# Altium footprint library PCB_Connector.PcbLib: 86 footprints (part 4 of 6)
Each footprint in its own frame and in the unit in brackets; x right, y up, seen from the top. Pads: shape width x height; smd on the part's side, far side on the other; paste and mask are expansions set on the pad; w line width, h text height; cw(c..) or ccw(c..) is an arc to the next point about the centre after c.
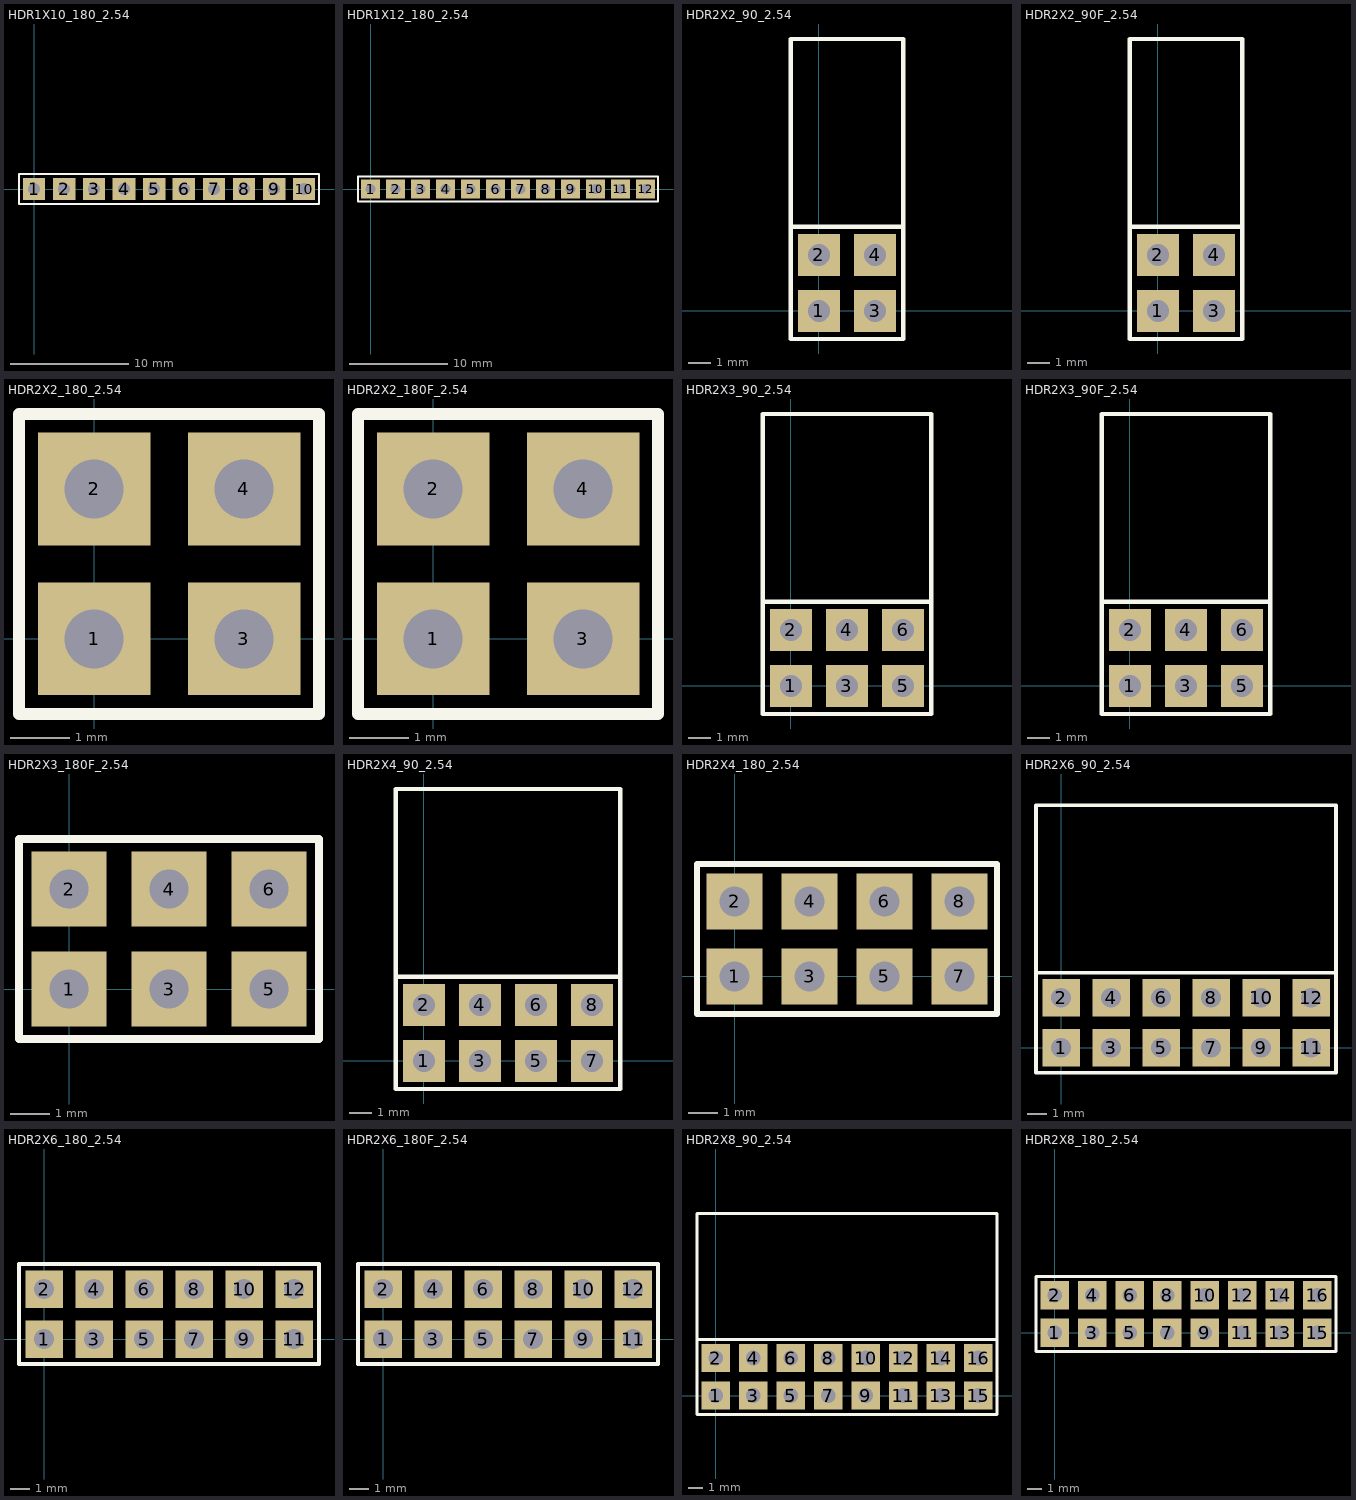
[diagram p3: the footprints below, top view; thin cyan lines are the x and y axes]

## HDR1X10_180_2.54 [mm] "Connector; Header; 8 Position"
height 4.3
pads (10):
  rect 1.905x1.905 hole 1: 1(0,0) 2(2.54,0) 3(5.08,0) 4(7.62,0) 5(10.16,0) 6(12.7,0) 7(15.24,0) 8(17.78,0) 9(20.32,0) 10(22.86,0)
Top Overlay:
  lines w0.2: -1.27,-1.27 24.13,-1.27 24.13,1.27 -1.27,1.27 -1.27,-1.27
3D body: height 7.58, standoff -2.94, extent 21.59,-1.27 24.13,1.27
3D body: height 7.58, standoff -2.94, extent 19.05,-1.27 21.59,1.27
3D body: height 7.58, standoff -2.94, extent 16.51,-1.27 19.05,1.27
3D body: height 7.58, standoff -2.94, extent 13.97,-1.27 16.51,1.27
3D body: height 7.58, standoff -2.94, extent 11.43,-1.27 13.97,1.27
3D body: height 7.58, standoff -2.94, extent 8.89,-1.27 11.43,1.27
3D body: height 7.58, standoff -2.94, extent 6.35,-1.27 8.89,1.27
3D body: height 7.58, standoff -2.94, extent 1.27,-1.27 3.81,1.27
3D body: height 7.58, standoff -2.94, extent 3.81,-1.27 6.35,1.27
3D body: height 7.58, standoff -2.94, extent -1.27,-1.27 1.27,1.27

## HDR1X12_180_2.54 [mm] "Connector; Header; 8 Position"
height 4.3
pads (12):
  rect 1.905x1.905 hole 1: 1(0,0) 2(2.54,0) 3(5.08,0) 4(7.62,0) 5(10.16,0) 6(12.7,0) 7(15.24,0) 8(17.78,0) 9(20.32,0) 10(22.86,0) 11(25.4,0) 12(27.94,0)
Top Overlay:
  lines w0.2: -1.27,-1.27 -1.27,1.27 29.21,1.27 29.21,-1.27 -1.27,-1.27
3D body: height 7.58, standoff -2.94, extent 24.13,-1.27 26.67,1.27
3D body: height 7.58, standoff -2.94, extent 26.67,-1.27 29.21,1.27
3D body: height 7.58, standoff -2.94, extent -1.27,-1.27 1.27,1.27
3D body: height 7.58, standoff -2.94, extent 3.81,-1.27 6.35,1.27
3D body: height 7.58, standoff -2.94, extent 1.27,-1.27 3.81,1.27
3D body: height 7.58, standoff -2.94, extent 6.35,-1.27 8.89,1.27
3D body: height 7.58, standoff -2.94, extent 8.89,-1.27 11.43,1.27
3D body: height 7.58, standoff -2.94, extent 11.43,-1.27 13.97,1.27
3D body: height 7.58, standoff -2.94, extent 13.97,-1.27 16.51,1.27
3D body: height 7.58, standoff -2.94, extent 16.51,-1.27 19.05,1.27
3D body: height 7.58, standoff -2.94, extent 19.05,-1.27 21.59,1.27
3D body: height 7.58, standoff -2.94, extent 21.59,-1.27 24.13,1.27

## HDR2X2_90_2.54 [mm] "Connector; Header; 2x2 Position"
height 4.3
pads (4):
  rect 1.905x1.905 hole 1: 1(0,0) 2(0,2.54) 3(2.54,0) 4(2.54,2.54)
Top Overlay:
  lines w0.2: -1.27,3.81 3.81,3.81 ; -1.27,-1.27 -1.27,12.319 3.81,12.319 3.81,-1.27 -1.27,-1.27
3D body: height 5.04, standoff -2.96, extent -1.27,-0.307 3.81,12.573

## HDR2X2_90F_2.54 [mm] "Connector; Header; 2x2 Position"
height 4.3
pads (4):
  rect 1.905x1.905 hole 1: 1(0,0) 2(0,2.54) 3(2.54,0) 4(2.54,2.54)
Top Overlay:
  lines w0.2: -1.27,3.81 3.81,3.81 ; -1.27,-1.27 -1.27,12.319 3.81,12.319 3.81,-1.27 -1.27,-1.27
3D body: height 5.04, standoff -3.16, extent -1.395,-0.163 3.935,12.437

## HDR2X2_180_2.54 [mm] "Connector; Header; 2x2 Position"
height 4.3
pads (4):
  rect 1.905x1.905 hole 1: 1(0,0) 2(0,2.54) 3(2.54,0) 4(2.54,2.54)
Top Overlay:
  lines w0.2: -1.27,-1.27 3.81,-1.27 3.81,3.81 -1.27,3.81 -1.27,-1.27
3D body: height 7.58, standoff -2.94, extent 1.27,-1.27 3.81,1.27
3D body: height 7.58, standoff -2.94, extent -1.27,-1.27 1.27,1.27
3D body: height 7.58, standoff -2.94, extent 1.27,1.27 3.81,3.81
3D body: height 7.58, standoff -2.94, extent -1.27,1.27 1.27,3.81

## HDR2X2_180F_2.54 [mm] "Connector; Header; 2x2 Position"
height 4.3
pads (4):
  rect 1.905x1.905 hole 1: 1(0,0) 2(0,2.54) 3(2.54,0) 4(2.54,2.54)
Top Overlay:
  lines w0.2: -1.27,-1.27 3.81,-1.27 3.81,3.81 -1.27,3.81 -1.27,-1.27
3D body: height 8.5, standoff -3.2, extent -1.395,-1.23 3.935,3.77

## HDR2X3_90_2.54 [mm] "Connector; Header; 2x2 Position"
height 4.3
pads (6):
  rect 1.905x1.905 hole 1: 1(0,0) 2(0,2.54) 3(2.54,0) 4(2.54,2.54) 5(5.08,0) 6(5.08,2.54)
Top Overlay:
  lines w0.2: -1.27,3.81 6.35,3.81 ; -1.27,-1.27 -1.27,12.319 6.35,12.319 6.35,-1.27 -1.27,-1.27
3D body: height 5.04, standoff -2.96, extent -1.27,-0.316 6.35,12.564

## HDR2X3_90F_2.54 [mm] "Connector; Header; 2x2 Position"
height 4.3
pads (6):
  rect 1.905x1.905 hole 1: 1(0,0) 2(0,2.54) 3(2.54,0) 4(2.54,2.54) 5(5.08,0) 6(5.08,2.54)
Top Overlay:
  lines w0.2: -1.27,3.81 6.35,3.81 ; -1.27,-1.27 6.35,-1.27 6.35,12.319 -1.27,12.319 -1.27,-1.27
3D body: height 5.04, standoff -3.16, extent -1.395,-0.154 6.475,12.446

## HDR2X3_180F_2.54 [mm] "Connector; Header; 2x2 Position"
height 4.3
pads (6):
  rect 1.905x1.905 hole 1: 1(0,0) 2(0,2.54) 3(2.54,0) 4(2.54,2.54) 5(5.08,0) 6(5.08,2.54)
Top Overlay:
  lines w0.2: -1.27,-1.27 -1.27,3.81 6.35,3.81 6.35,-1.27 -1.27,-1.27
3D body: height 8.5, standoff -3.2, extent -1.395,-1.23 6.475,3.77

## HDR2X4_90_2.54 [mm] "Connector; Header; 2x2 Position"
height 4.3
pads (8):
  rect 1.905x1.905 hole 1: 1(0,0) 2(0,2.54) 3(2.54,0) 4(2.54,2.54) 5(5.08,0) 6(5.08,2.54) 7(7.62,0) 8(7.62,2.54)
Top Overlay:
  lines w0.2: -1.27,3.81 8.89,3.81 ; -1.27,-1.27 8.89,-1.27 8.89,12.319 -1.27,12.319 -1.27,-1.27
3D body: height 5.04, standoff -2.96, extent -1.27,-0.307 3.81,12.573
3D body: height 5.04, standoff -2.96, extent 3.81,-0.307 8.89,12.573

## HDR2X4_180_2.54 [mm] "Connector; Header; 4x2 Position"
height 4.3
pads (8):
  rect 1.905x1.905 hole 1: 1(0,0) 2(0,2.54) 3(2.54,0) 4(2.54,2.54) 5(5.08,0) 6(5.08,2.54) 7(7.62,0) 8(7.62,2.54)
Top Overlay:
  lines w0.2: -1.27,-1.27 -1.27,3.81 8.89,3.81 8.89,-1.27 -1.27,-1.27
3D body: height 7.58, standoff -2.94, extent 1.27,1.27 3.81,3.81
3D body: height 7.58, standoff -2.94, extent -1.27,1.27 1.27,3.81
3D body: height 7.58, standoff -2.94, extent -1.27,-1.27 1.27,1.27
3D body: height 7.58, standoff -2.94, extent 3.81,1.27 6.35,3.81
3D body: height 7.58, standoff -2.94, extent 1.27,-1.27 3.81,1.27
3D body: height 7.58, standoff -2.94, extent 3.81,-1.27 6.35,1.27
3D body: height 7.58, standoff -2.94, extent 6.35,1.27 8.89,3.81
3D body: height 7.58, standoff -2.94, extent 6.35,-1.27 8.89,1.27

## HDR2X6_90_2.54 [mm] "Connector; Header; 2x2 Position"
height 4.3
pads (12):
  rect 1.905x1.905 hole 1: 1(0,0) 2(0,2.54) 3(2.54,0) 4(2.54,2.54) 5(5.08,0) 6(5.08,2.54) 7(7.62,0) 8(7.62,2.54) 9(10.16,0) 10(10.16,2.54) 11(12.7,0) 12(12.7,2.54)
Top Overlay:
  lines w0.2: -1.27,3.81 13.97,3.81 ; -1.27,-1.27 -1.27,12.319 13.97,12.319 13.97,-1.27 -1.27,-1.27
3D body: height 5.04, standoff -2.96, extent 6.35,-0.316 13.97,12.564
3D body: height 5.04, standoff -2.96, extent -1.27,-0.316 6.35,12.564

## HDR2X6_180_2.54 [mm] "Connector; Header; 8x2 Position"
height 4.3
pads (12):
  rect 1.905x1.905 hole 1: 1(0,0) 2(0,2.54) 3(2.54,0) 4(2.54,2.54) 5(5.08,0) 6(5.08,2.54) 7(7.62,0) 8(7.62,2.54) 9(10.16,0) 10(10.16,2.54) 11(12.7,0) 12(12.7,2.54)
Top Overlay:
  lines w0.2: -1.27,-1.27 13.97,-1.27 13.97,3.81 -1.27,3.81 -1.27,-1.27
3D body: height 7.58, standoff -2.94, extent 11.43,-1.27 13.97,1.27
3D body: height 7.58, standoff -2.94, extent 8.89,-1.27 11.43,1.27
3D body: height 7.58, standoff -2.94, extent 6.35,-1.27 8.89,1.27
3D body: height 7.58, standoff -2.94, extent 3.81,-1.27 6.35,1.27
3D body: height 7.58, standoff -2.94, extent 1.27,-1.27 3.81,1.27
3D body: height 7.58, standoff -2.94, extent -1.27,-1.27 1.27,1.27
3D body: height 7.58, standoff -2.94, extent 11.43,1.27 13.97,3.81
3D body: height 7.58, standoff -2.94, extent 8.89,1.27 11.43,3.81
3D body: height 7.58, standoff -2.94, extent 6.35,1.27 8.89,3.81
3D body: height 7.58, standoff -2.94, extent 3.81,1.27 6.35,3.81
3D body: height 7.58, standoff -2.94, extent 1.27,1.27 3.81,3.81
3D body: height 7.58, standoff -2.94, extent -1.27,1.27 1.27,3.81

## HDR2X6_180F_2.54 [mm] "Connector; Header; 8x2 Position"
height 4.3
pads (12):
  rect 1.905x1.905 hole 1: 1(0,0) 2(0,2.54) 3(2.54,0) 4(2.54,2.54) 5(5.08,0) 6(5.08,2.54) 7(7.62,0) 8(7.62,2.54) 9(10.16,0) 10(10.16,2.54) 11(12.7,0) 12(12.7,2.54)
Top Overlay:
  lines w0.2: -1.27,-1.27 -1.27,3.81 13.97,3.81 13.97,-1.27 -1.27,-1.27
3D body: height 8.5, standoff -3.2, extent -1.395,-1.23 6.475,3.77
3D body: height 8.5, standoff -3.2, extent 6.225,-1.23 14.095,3.77

## HDR2X8_90_2.54 [mm] "Connector; Header; 2x2 Position"
height 4.3
pads (16):
  rect 1.905x1.905 hole 1: 1(0,0) 2(0,2.54) 3(2.54,0) 4(2.54,2.54) 5(5.08,0) 6(5.08,2.54) 7(7.62,0) 8(7.62,2.54) 9(10.16,0) 10(10.16,2.54) 11(12.7,0) 12(12.7,2.54) 13(15.24,0) 14(15.24,2.54) 15(17.78,0) 16(17.78,2.54)
Top Overlay:
  lines w0.2: -1.27,3.81 19.05,3.81 ; -1.27,-1.27 -1.27,12.319 19.05,12.319 19.05,-1.27 -1.27,-1.27
3D body: height 5.04, standoff -2.96, extent -1.27,-0.307 3.81,12.573
3D body: height 5.04, standoff -2.96, extent 3.81,-0.307 8.89,12.573
3D body: height 5.04, standoff -2.96, extent 8.89,-0.307 13.97,12.573
3D body: height 5.04, standoff -2.96, extent 13.97,-0.307 19.05,12.573

## HDR2X8_180_2.54 [mm] "Connector; Header; 8x2 Position"
height 4.3
pads (16):
  rect 1.905x1.905 hole 1: 1(0,0) 2(0,2.54) 3(2.54,0) 4(2.54,2.54) 5(5.08,0) 6(5.08,2.54) 7(7.62,0) 8(7.62,2.54) 9(10.16,0) 10(10.16,2.54) 11(12.7,0) 12(12.7,2.54) 13(15.24,0) 14(15.24,2.54) 15(17.78,0) 16(17.78,2.54)
Top Overlay:
  lines w0.2: -1.27,-1.27 -1.27,3.81 19.05,3.81 19.05,-1.27 -1.27,-1.27
3D body: height 7.58, standoff -2.94, extent -1.27,1.27 1.27,3.81
3D body: height 7.58, standoff -2.94, extent 1.27,1.27 3.81,3.81
3D body: height 7.58, standoff -2.94, extent 3.81,1.27 6.35,3.81
3D body: height 7.58, standoff -2.94, extent 6.35,1.27 8.89,3.81
3D body: height 7.58, standoff -2.94, extent 8.89,1.27 11.43,3.81
3D body: height 7.58, standoff -2.94, extent 11.43,1.27 13.97,3.81
3D body: height 7.58, standoff -2.94, extent 13.97,1.27 16.51,3.81
3D body: height 7.58, standoff -2.94, extent 16.51,1.27 19.05,3.81
3D body: height 7.58, standoff -2.94, extent 16.51,-1.27 19.05,1.27
3D body: height 7.58, standoff -2.94, extent 13.97,-1.27 16.51,1.27
3D body: height 7.58, standoff -2.94, extent 8.89,-1.27 11.43,1.27
3D body: height 7.58, standoff -2.94, extent 11.43,-1.27 13.97,1.27
3D body: height 7.58, standoff -2.94, extent 6.35,-1.27 8.89,1.27
3D body: height 7.58, standoff -2.94, extent 1.27,-1.27 3.81,1.27
3D body: height 7.58, standoff -2.94, extent 3.81,-1.27 6.35,1.27
3D body: height 7.58, standoff -2.94, extent -1.27,-1.27 1.27,1.27